# Altium footprint library biblioteka_pcb.PcbLib: 184 footprints (part 11 of 12)
Each footprint in its own frame and in the unit in brackets; x right, y up, seen from the top. Pads: shape width x height; smd on the part's side, far side on the other; paste and mask are expansions set on the pad; w line width, h text height; cw(c..) or ccw(c..) is an arc to the next point about the centre after c.
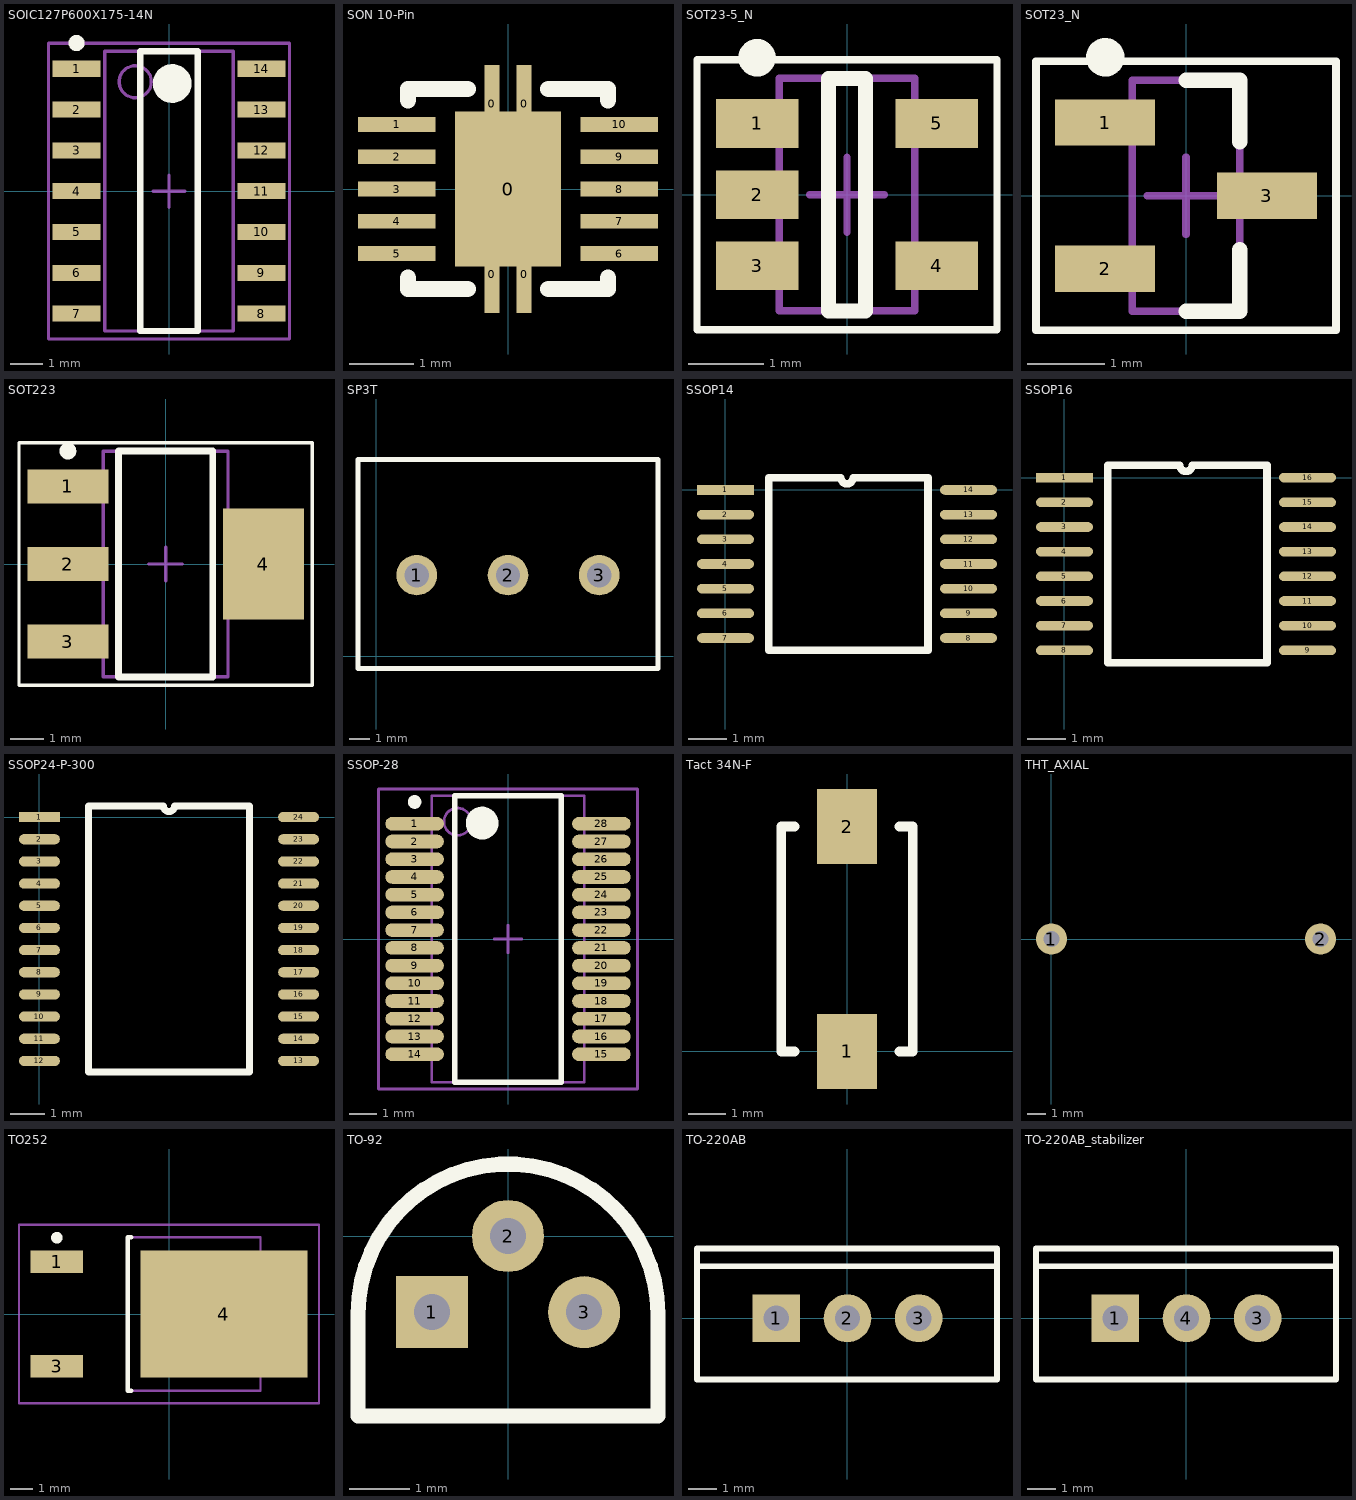
[diagram p10: the footprints below, top view; thin cyan lines are the x and y axes]

## SOIC127P600X175-14N [mm] "SOIC, 14-Leads, Body 8,7x4,0mm (max), Pitch 1,27mm, IPC Medium Density"
height 1.75
pads (14):
  rect 1.5x0.5 smd: 1(-2.875,3.81) 2(-2.875,2.54) 3(-2.875,1.27) 4(-2.875,0) 5(-2.875,-1.27) 6(-2.875,-2.54) 7(-2.875,-3.81) 8(2.875,-3.81) 9(2.875,-2.54) 10(2.875,-1.27) 11(2.875,0) 12(2.875,1.27) 13(2.875,2.54) 14(2.875,3.81)
Top Overlay:
  circle w0.6: c0.1,3.35 r0.3
  circle w0.25: c-2.875,4.61 r0.125
  lines w0.2: -0.9,-4.35 0.9,-4.35 0.9,4.35 -0.9,4.35 -0.9,-4.35
Mechanical 13:
  circle w0.1: c-1.05,3.405 r0.5
  lines w0.1: -2,-4.355 2,-4.355 2,4.355 -2,4.355 -2,-4.355
Mechanical 15:
  lines w0.1: -0.5,0 0.5,0 ; 0,-0.5 0,0.5 ; -3.75,-4.6 3.75,-4.6 3.75,4.6 -3.75,4.6 -3.75,-4.6
3D body "SOIC14.stp": height 1.75, standoff 0, extent -3.1,-4.35 3.1,4.35

## SON 10-Pin [mm]
pads (15):
  rect 0.23x1.2 smd: 0(-0.25,-1.325) 0(-0.25,1.325) 0(0.25,-1.325) 0(0.25,1.325)
  rect 1.65x2.4 smd: 0(0,0)
  rect 1.2x0.23 smd: 1(-1.725,1) 2(-1.725,0.5) 3(-1.725,0) 4(-1.725,-0.5) 5(-1.725,-1) 6(1.725,-1) 7(1.725,-0.5) 8(1.725,0) 9(1.725,0.5) 10(1.725,1)
Top Overlay:
  lines w0.254: -1.55,-1.375 -1.55,-1.55 -0.625,-1.55 ; -1.55,1.375 -1.55,1.55 -0.625,1.55 ; 0.625,-1.55 1.55,-1.55 1.55,-1.375 ; 0.625,1.55 1.55,1.55 1.55,1.375

## SOT23-5_N [mm] "SOT23, 5-Leads, Body 2.9x1.6mm, Pitch 0.95mm, Lead Span 2.8mm, IPC Medium Density"
height 1.45
pads (5):
  rect 1.1x0.65 smd: 1(-1.2,0.95) 2(-1.2,0) 3(-1.2,-0.95) 4(1.2,-0.95) 5(1.2,0.95)
Top Overlay:
  circle w0.25: c-1.2,1.825 r0.125
  lines w0.1: -2,-1.8 2,-1.8 2,1.8 -2,1.8 -2,-1.8
  lines w0.2: -0.25,-1.55 -0.25,1.55 0.25,1.55 0.25,-1.55 -0.25,-1.55
Mechanical 13:
  lines w0.1: -0.9,-1.55 0.9,-1.55 0.9,1.55 -0.9,1.55 -0.9,-1.55
Mechanical 15:
  lines w0.1: -0.5,0 0.5,0 ; 0,-0.5 0,0.5
3D body "SOT23-5.stp": height 1.1, standoff 0, extent -1.625,-1.5 1.575,1.5

## SOT23_N [mm]
pads (3):
  rect 1.3x0.6 smd: 1(-1.05,0.95) 2(-1.05,-0.95) 3(1.05,0)
Top Overlay:
  circle w0.25: c-1.05,1.8 r0.125
  lines w0.1: -1.95,-1.75 -1.95,1.75 1.95,1.75 1.95,-1.75 -1.95,-1.75
  lines w0.2: 0,-1.5 0.7,-1.5 0.7,-0.7 ; 0,1.5 0.7,1.5 0.7,0.7
Mechanical 13:
  lines w0.1: -0.7,-1.5 -0.7,1.5 0.7,1.5 0.7,-1.5 -0.7,-1.5
Mechanical 15:
  lines w0.1: -0.5,0 0.5,0 ; 0,-0.5 0,0.5
3D body "SOT23.stp": height 1.1, standoff 0, extent -1.6,-1.5 1.6,1.5

## SOT223 [mm]
pads (4):
  rect 2.4x1 smd: 1(-2.9,2.3) 2(-2.9,0) 3(-2.9,-2.3)
  rect 2.4x3.3 smd: 4(2.9,0)
Top Overlay:
  circle w0.25: c-2.9,3.35 r0.125
  lines w0.1: -4.35,-3.6 -4.35,3.6 4.35,3.6 4.35,-3.6 -4.35,-3.6
  lines w0.2: -1.4,-3.35 -1.4,3.35 1.4,3.35 1.4,-3.35 -1.4,-3.35
Mechanical 13:
  lines w0.1: -1.85,-3.35 -1.85,3.35 1.85,3.35 1.85,-3.35 -1.85,-3.35
Mechanical 15:
  lines w0.1: -0.5,0 0.5,0 ; 0,-0.5 0,0.5
3D body "SOT223.stp": height 1.8, standoff 0, extent -3.45,-3.3 3.3,3.2

## SP3T [mm] "SP3T ON-OFF-ON switch"
pads (3):
  round 2 hole 1.2: 1(2,4) 2(6.5,4) 3(11,4)
Top Overlay:
  lines w0.254: -0.9,-0.6 -0.9,9.7 13.9,9.7 13.9,-0.6 -0.9,-0.6
3D body "SP3T.stp": height 28.24, standoff -1.2, extent -0.833,-1.394 12.961,10.604

## SSOP14 [mm]
pads (14):
  rect 1.5x0.254 smd: 1(0,0)
  oval 1.5x0.254 smd: 2(0,-0.65) 3(0,-1.3) 4(0,-1.95) 5(0,-2.6) 6(0,-3.25) 7(0,-3.9) 8(6.4,-3.9) 9(6.4,-3.25) 10(6.4,-2.6) 11(6.4,-1.95) 12(6.4,-1.3) 13(6.4,-0.65) 14(6.4,0)
Top Overlay:
  lines w0.2: 1.143,-4.225 1.143,0.325 3.037,0.325 ccw(c3.2,0.325) 3.362,0.325 5.334,0.325 5.334,-4.225 1.143,-4.225

## SSOP16 [mm]
pads (16):
  rect 1.5x0.254 smd: 1(0,0)
  oval 1.5x0.254 smd: 2(0,-0.65) 3(0,-1.3) 4(0,-1.95) 5(0,-2.6) 6(0,-3.25) 7(0,-3.9) 8(0,-4.55) 9(6.4,-4.55) 10(6.4,-3.9) 11(6.4,-3.25) 12(6.4,-2.6) 13(6.4,-1.95) 14(6.4,-1.3) 15(6.4,-0.65) 16(6.4,0)
Top Overlay:
  lines w0.2: 1.143,-4.875 1.143,0.325 3.037,0.325 ccw(c3.2,0.325) 3.362,0.325 5.334,0.325 5.334,-4.875 1.143,-4.875
3D body "SSOP16.stp": height 1.6, standoff 0, extent -0.025,-5.036 6.375,0.464

## SSOP24-P-300 [mm]
pads (24):
  rect 1.2x0.3 smd: 1(0,0)
  oval 1.2x0.3 smd: 2(0,-0.65) 3(0,-1.3) 4(0,-1.95) 5(0,-2.6) 6(0,-3.25) 7(0,-3.9) 8(0,-4.55) 9(0,-5.2) 10(0,-5.85) 11(0,-6.5) 12(0,-7.15) 13(7.6,-7.15) 14(7.6,-6.5) 15(7.6,-5.85) 16(7.6,-5.2) 17(7.6,-4.55) 18(7.6,-3.9) 19(7.6,-3.25) 20(7.6,-2.6) 21(7.6,-1.95) 22(7.6,-1.3) 23(7.6,-0.65) 24(7.6,0)
Top Overlay:
  lines w0.2: 1.435,-7.475 1.435,0.325 3.638,0.325 ccw(c3.8,0.325) 3.962,0.325 6.165,0.325 6.165,-7.475 1.435,-7.475
3D body "SSOP24-P-300.stp": height 1.6, standoff 0, extent 0,-7.75 7.6,0.55

## SSOP-28 [mm] "SOP, 28-Leads, Body 10,5x5,6mm (max), Pitch 0,65mm"
height 2
pads (28):
  oval 2.15x0.5 smd: 1(-3.425,4.225) 2(-3.425,3.575) 3(-3.425,2.925) 4(-3.425,2.275) 5(-3.425,1.625) 6(-3.425,0.975) 7(-3.425,0.325) 8(-3.425,-0.325) 9(-3.425,-0.975) 10(-3.425,-1.625) 11(-3.425,-2.275) 12(-3.425,-2.925) 13(-3.425,-3.575) 14(-3.425,-4.225) 15(3.425,-4.225) 16(3.425,-3.575) 17(3.425,-2.925) 18(3.425,-2.275) 19(3.425,-1.625) 20(3.425,-0.975) 21(3.425,-0.325) 22(3.425,0.325) 23(3.425,0.975) 24(3.425,1.625) 25(3.425,2.275) 26(3.425,2.925) 27(3.425,3.575) 28(3.425,4.225)
Top Overlay:
  circle w0.6: c-0.95,4.25 r0.3
  circle w0.25: c-3.425,5.025 r0.125
  lines w0.2: -1.95,-5.25 1.95,-5.25 1.95,5.25 -1.95,5.25 -1.95,-5.25
Mechanical 13:
  circle w0.1: c-1.85,4.3 r0.5
  lines w0.1: -2.8,-5.25 2.8,-5.25 2.8,5.25 -2.8,5.25 -2.8,-5.25
Mechanical 15:
  lines w0.1: -0.5,0 0.5,0 ; 0,-0.5 0,0.5 ; -4.75,-5.5 4.75,-5.5 4.75,5.5 -4.75,5.5 -4.75,-5.5
3D body "SSOP-28.stp": height 1.8, standoff 0, extent -4.2,-5.25 4.2,5.25

## Tact 34N-F [mm]
pads (2):
  rect 1.6x2 smd: 1(0,0) 2(0,6)
Top Overlay:
  lines w0.254: -1.4,0 -1.75,0 -1.75,6 -1.4,6 ; 1.4,0 1.75,0 1.75,6 1.4,6
3D body "TACT 34N-F.stp": height 4.2, standoff 0, extent -1.75,-0.7 1.75,6.7

## THT_AXIAL [mm] "General THT AXIAL element"
pads (2):
  round 1.7 hole 0.9: 1(0,0) 2(14.8,0)
3D body "THT_AXIAL.stp": height 3.2, standoff -2.4, extent -0.232,-1.27 14.964,1.123

## TO252 [mm] "D-PAK, 3-Pads, Body 5,8x6,7mm (max), IPC Low Density"
height 2.38
pads (3):
  rect 2.3x1 smd: 1(-4.9,2.28) 3(-4.9,-2.28)
  rect 7.3x5.55 smd: 4(2.4,0)
Top Overlay:
  circle w0.25: c-4.9,3.33 r0.125
  lines w0.2: -1.65,-3.35 -1.8,-3.35 -1.8,3.35 -1.65,3.35
Mechanical 13:
  lines w0.1: -1.8,-3.35 -1.8,3.35 4,3.35 4,-3.35 -1.8,-3.35
Mechanical 15:
  lines w0.1: -0.5,0 0.5,0 ; 0,-0.5 0,0.5 ; -6.55,-3.9 -6.55,3.9 6.55,3.9 6.55,-3.9 -6.55,-3.9
3D body "TO252_D-Pak.stp": height 2.2, standoff 0, extent -4.74,-3.25 5.2,3.25

## TO-92 [mm]
pads (3):
  rect 1.2x1.2 hole 0.6: 1(-1.27,-1.27)
  round 1.2 hole 0.6: 2(0,0) 3(1.27,-1.27)
Top Overlay:
  lines w0.254: -2.5,-3 -2.5,-1.3 cw(c0,-1.3) 2.5,-1.3 2.5,-3 -2.5,-3
3D body "TO-92.stp": height 6.5, standoff -1.49, extent -2.3,-2.794 2.3,0.706

## TO-220AB [mm] "TO, Thru-Hole, Vertical, Heatsink Mounted; 3 In-Line Leads; Pitch 2.54 mm"
height 19.3
pads (3):
  rect 1.7x1.7 hole 0.9: 1(-2.54,0)
  round 1.7 hole 0.9: 2(0,0) 3(2.54,0)
Top Overlay:
  lines w0.2: -5.366,1.854 5.334,1.854 ; -5.366,-2.184 5.334,-2.184 5.334,2.489 -5.366,2.489 -5.366,-2.184
3D body: height 5, standoff 0, extent -0.4,-0.25 0.4,0.25
3D body: height 5, standoff 0, extent 2.1,-0.25 2.9,0.25
3D body: height 5, standoff 0, extent -2.9,-0.25 -2.1,0.25
3D body "TO220.stp": height 19.5, standoff -3, extent -5,-2.089 5,2.311

## TO-220AB_stabilizer [mm] "TO, Thru-Hole, Vertical, Heatsink Mounted; PIN2->PIN4"
height 19.3
pads (3):
  rect 1.7x1.7 hole 0.9: 1(-2.54,0)
  round 1.7 hole 0.9: 3(2.54,0) 4(0,0)
Top Overlay:
  lines w0.2: -5.366,1.854 5.334,1.854 ; -5.366,-2.184 5.334,-2.184 5.334,2.489 -5.366,2.489 -5.366,-2.184
3D body: height 5, standoff 0, extent -0.4,-0.25 0.4,0.25
3D body: height 5, standoff 0, extent 2.1,-0.25 2.9,0.25
3D body: height 5, standoff 0, extent -2.9,-0.25 -2.1,0.25
3D body "TO220.stp": height 19.5, standoff -3, extent -5,-2.089 5,2.311